# Altium footprint library BMS_Fuse_lib.PcbLib: 19 footprints (part 1 of 2)
Each footprint in its own frame and in the unit in brackets; x right, y up, seen from the top. Pads: shape width x height; smd on the part's side, far side on the other; paste and mask are expansions set on the pad; w line width, h text height; cw(c..) or ccw(c..) is an arc to the next point about the centre after c.
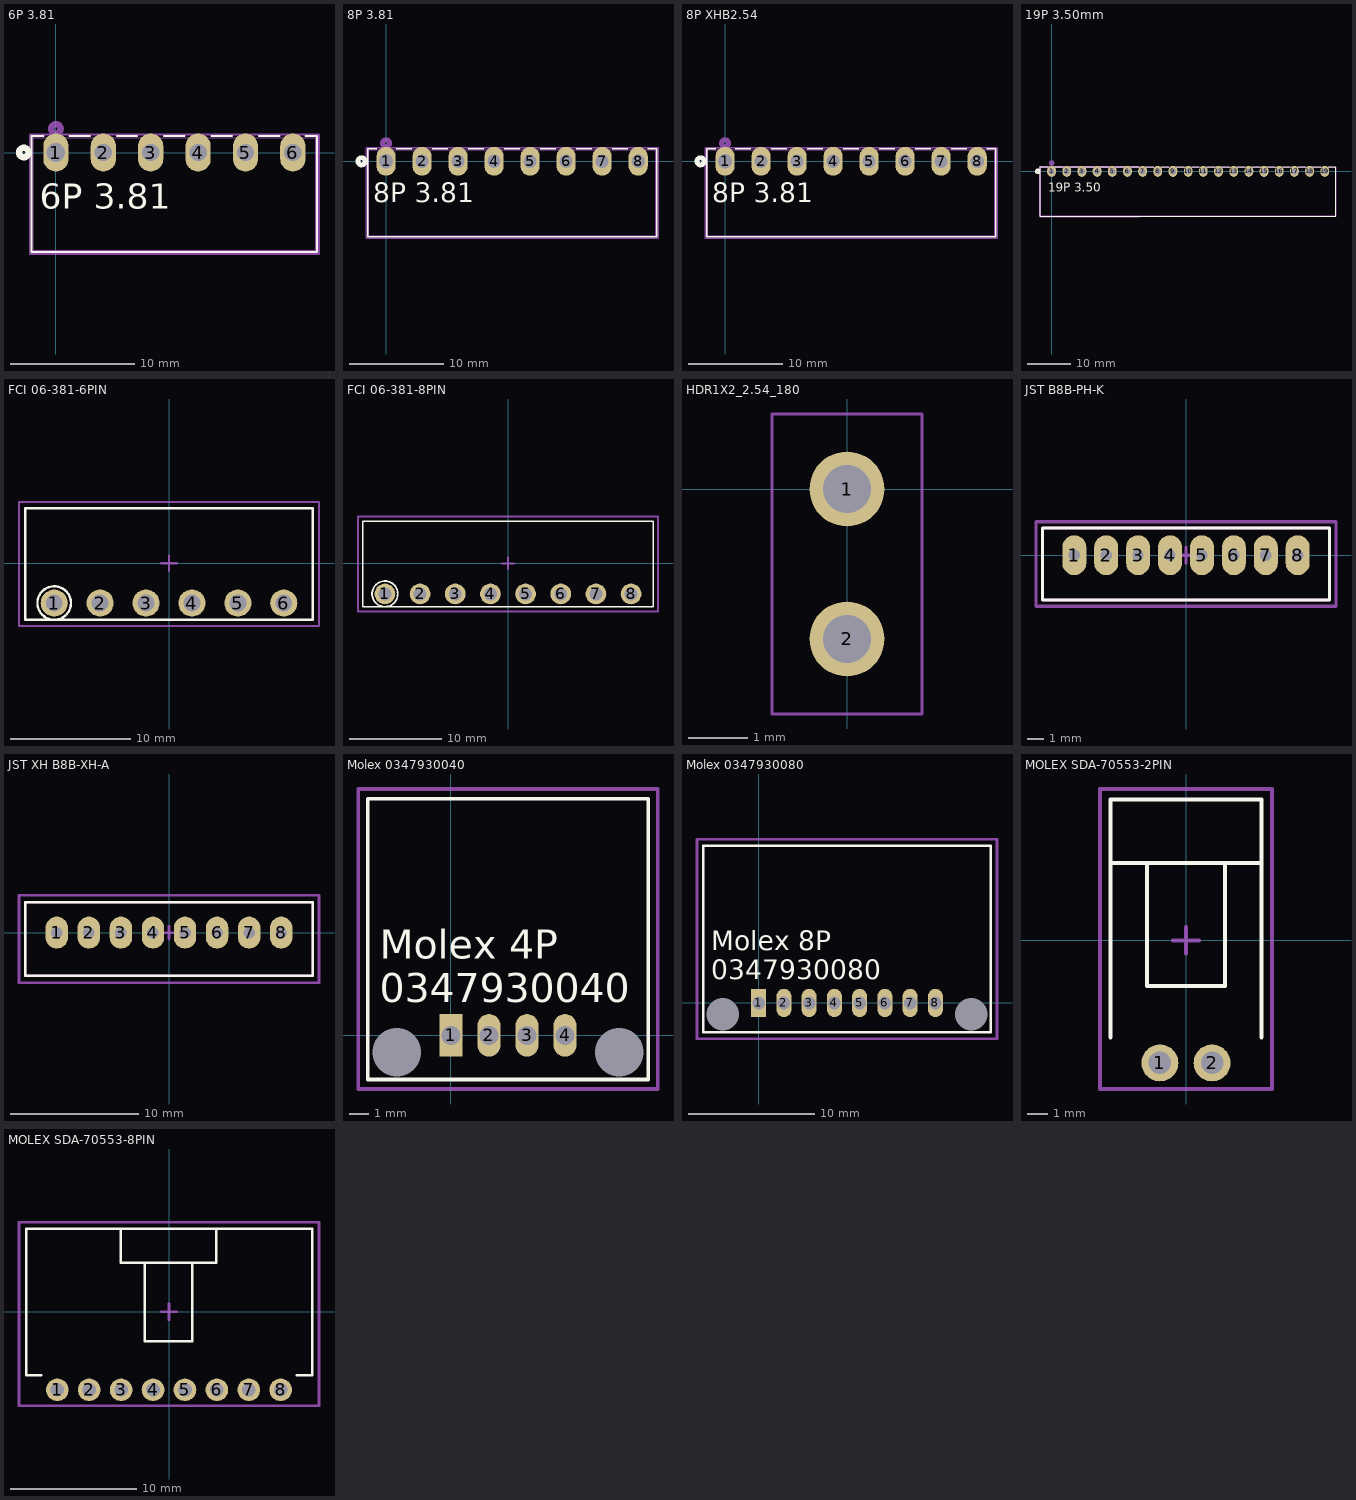
[diagram p0: the footprints below, top view; thin cyan lines are the x and y axes]

## 6P 3.81 [mil] "CONN., FEMALE, PCB-PLUG with Clamping yoke connection, 1X19, 3.50mm HORZ. R/A"
height 700
pads (6):
  oval 80x120 hole 59.06 mask+0: 1(0,0)
  oval 80x120 hole 55.12 mask+0: 2(150,0) 3(300,0) 4(450,0) 5(600,0) 6(750,0)
Top Overlay:
  circle w20: c-101.77,0 r15
  lines w6: -39.37,52 -76.77,52 -76.77,-314.96 698.88,-314.96 826.77,-314.96 826.77,52 789.37,52 ; 42.63,52.24 107.37,52.24 ; 192.63,52.24 257.37,52.24 ; 342.63,52.24 407.37,52.24 ; 492.63,52.24 557.37,52.24 ; 642.63,52.24 707.37,52.24
  text "6P 3.81" at -51.18,-177.17 h80
Mechanical 13:
  circle w20: c0,75 r15
  lines w1: -72.02,47.24 822.83,47.24 822.83,-310.04 -71.85,-310.04 -71.85,47.24
Mechanical 15:
  lines w6: -82.68,-320.87 -82.68,57.09 832.68,57.09 832.68,-320.87 -82.68,-320.87
3D body: height 10, standoff 0, extent 0,0 10,10
3D body "FCI 06-381 6Pos.STEP": height 299.21, standoff -138.78, extent -98.42,-307.21 848.42,55

## 8P 3.81 [mil] "CONN., FEMALE, PCB-PLUG with Clamping yoke connection, 1X19, 3.50mm HORZ. R/A"
height 700
pads (8):
  oval 80x120 hole 59.06 mask+0: 1(0,0)
  oval 80x120 hole 55.12 mask+0: 2(150,0) 3(300,0) 4(450,0) 5(600,0) 6(750,0) 7(900,0) 8(1050,0)
Top Overlay:
  circle w20: c-101.77,0 r15
  lines w6: -39.37,52 -76.77,52 -76.77,-314.96 698.88,-314.96 1126.77,-314.96 1126.77,52 1089.37,52 ; 42.63,52.24 107.37,52.24 ; 192.63,52.24 257.37,52.24 ; 342.63,52.24 407.37,52.24 ; 492.63,52.24 557.37,52.24 ; 642.63,52.24 707.37,52.24 ; 792.63,52.24 857.37,52.24 ; 942.63,52.24 1007.37,52.24
  text "8P 3.81" at -53.15,-170.28 h80
Mechanical 13:
  circle w20: c0,75 r15
  lines w1: -71.85,-310.04 -71.85,47.24 1122.83,47.24 1122.83,-310.04 -71.85,-310.04
Mechanical 15:
  lines w6: -82.68,-320.87 1132.68,-320.87 1132.68,57.09 -82.68,57.09 -82.68,-320.87
3D body: height 10, standoff 0, extent 0,0 10,10
3D body "FCI 06-381 8Pos.STEP": height 299.21, standoff -138.78, extent -98.42,-307.21 1148.42,55

## 8P XHB2.54 [mil] "CONN., FEMALE, PCB-PLUG with Clamping yoke connection, 1X19, 3.50mm HORZ. R/A"
height 700
pads (8):
  oval 80x120 hole 59.06 mask+0: 1(0,0)
  oval 80x120 hole 55.12 mask+0: 2(150,0) 3(300,0) 4(450,0) 5(600,0) 6(750,0) 7(900,0) 8(1050,0)
Top Overlay:
  circle w20: c-101.77,0 r15
  lines w6: -39.37,52 -76.77,52 -76.77,-314.96 698.88,-314.96 1126.77,-314.96 1126.77,52 1089.37,52 ; 42.63,52.24 107.37,52.24 ; 192.63,52.24 257.37,52.24 ; 342.63,52.24 407.37,52.24 ; 492.63,52.24 557.37,52.24 ; 642.63,52.24 707.37,52.24 ; 792.63,52.24 857.37,52.24 ; 942.63,52.24 1007.37,52.24
  text "8P 3.81" at -53.15,-170.28 h80
Mechanical 13:
  circle w20: c0,75 r15
  lines w1: -71.85,-310.04 1122.83,-310.04 1122.83,47.24 -71.85,47.24 -71.85,-310.04
Mechanical 15:
  lines w6: -82.68,-320.87 -82.68,57.09 1132.68,57.09 1132.68,-320.87 -82.68,-320.87
3D body: height 10, standoff 0, extent 0,0 10,10

## 19P 3.50mm [mil] "CONN., FEMALE, PCB-PLUG with Clamping yoke connection, 1X19, 3.50mm HORZ. R/A"
height 700
pads (19):
  oval 80x100 hole 55 mask+0: 1(0,0) 2(137.8,0) 3(275.59,0) 4(413.39,0) 5(551.18,0) 6(688.98,0) 7(826.77,0) 8(964.57,0) 9(1102.36,0) 10(1240.16,0) 11(1377.95,0) 12(1515.75,0) 13(1653.54,0) 14(1791.34,0) 15(1929.13,0) 16(2066.93,0) 17(2204.72,0) 18(2342.52,0) 19(2480.32,0)
Top Overlay:
  circle w20: c-126.51,0 r15
  lines w6: -30.42,40.43 -101.51,40.43 -101.51,-406.57 790.49,-406.57 2581.83,-406.57 2581.83,40.43 2510.74,40.43 ; 30.42,40.43 107.37,40.43 ; 168.22,40.43 245.17,40.43 ; 306.01,40.43 382.96,40.43 ; 443.81,40.43 520.76,40.43 ; 581.6,40.43 658.55,40.43 ; 719.4,40.43 790.49,40.43 ; 857.19,40.43 928.28,40.43 ; 994.99,40.43 1066.08,40.43 ; 1132.79,40.43 1203.87,40.43 ; 1270.58,40.43 1341.67,40.43 ; 1408.38,40.43 1479.46,40.43 ; 1546.17,40.43 1617.26,40.43 ; 1683.97,40.43 1755.06,40.43 ; 1821.76,40.43 1892.85,40.43 ; 1959.56,40.43 2030.65,40.43 ; 2097.35,40.43 2168.44,40.43 ; 2235.15,40.43 2306.24,40.43 ; 2372.94,40.43 2444.03,40.43
  text "19P 3.50" at -31.5,-184.06 h80
Bottom Overlay:
  circle w20: c-126.51,0 r15
Mechanical 13:
  circle w20: c0,75 r15
  lines w1: -96.51,-401.57 -96.51,35.43 2582.68,35.43 2582.68,-401.57 -96.51,-401.57
Mechanical 15:
  lines w6: 795.49,-411.57 -106.51,-411.57 -106.51,47.5 795.49,47.5
3D body "19P_v4.stp": height 218.34, standoff -434.59, extent -68.92,-444.52 2549.24,12.8
3D body: height 10, standoff 0, extent 0,0 10,10

## DHT11_v [mm]
3D body "DHT11_H.step": height 5.9, standoff -4.2, extent 6.05,-35.65 22.55,-22.95

## FCI 06-381-6PIN [mm] "FCI Pluggable Terminal Block"
height 7
pads (6):
  round 2.25 hole 1.4: 1(-9.525,-3.302) 2(-5.715,-3.302) 3(-1.905,-3.302) 4(1.905,-3.302) 5(5.715,-3.302) 6(9.525,-3.302)
Top Overlay:
  circle w0.2: c-9.525,-3.302 r1.393
  lines w0.2: -11.938,-4.699 11.938,-4.699 11.938,4.572 -11.938,4.572 -11.938,-4.699
Mechanical 15:
  lines w0.2: -0.635,0 0.635,0 ; 0,-0.635 0,0.635 ; -12.446,-5.207 12.446,-5.207 12.446,5.08 -12.446,5.08 -12.446,-5.207
3D body "FCI 06-381 6Pos.STEP": height 7.6, standoff -3.52, extent -12.025,-4.699 12.025,4.501

## FCI 06-381-8PIN [mm] "FCI Pluggable Terminal Block"
height 7
pads (8):
  round 2.25 hole 1.4: 1(-13.335,-3.302) 2(-9.525,-3.302) 3(-5.715,-3.302) 4(-1.905,-3.302) 5(1.905,-3.302) 6(5.715,-3.302) 7(9.525,-3.302) 8(13.335,-3.302)
Top Overlay:
  circle w0.2: c-13.335,-3.302 r1.393
  lines w0.2: -15.748,-4.699 15.748,-4.699 15.748,4.572 -15.748,4.572 -15.748,-4.699
Mechanical 15:
  lines w0.2: -0.635,0 0.635,0 ; 0,-0.635 0,0.635 ; -16.256,-5.207 16.256,-5.207 16.256,5.08 -16.256,5.08 -16.256,-5.207
3D body "FCI 06-381 8Pos.STEP": height 7.6, standoff -3.52, extent -15.835,-4.699 15.835,4.501

## HDR1X2_2.54_180 [mil]
height 169.29
pads (2):
  round 50 hole 32: 1(0,0) 2(0,-100)
Mechanical 13:
  lines w2: -50,-150 50,-150 50,50 -50,50 -50,-150
Mechanical 14:
  lines w2: -50,-150 50,-150 50,50 -50,50 -50,-150
  text ".Designator" at -31,-70 h80
3D body "pin_header_aw140-eg-g02d.stp": height 322.83, standoff -118.11, extent -49.18,-150 49.18,50

## JST B8B-PH-K [mm]
height 6
pads (8):
  oval 1.5x2.5 hole 0.7: 1(-7,0) 2(-5,0) 3(-3,0) 4(-1,0) 5(1,0) 6(3,0) 7(5,0) 8(7,0)
Top Overlay:
  lines w0.2: -9,-2.8 -9,1.7 9,1.7 9,-2.8 -9,-2.8
Bottom Overlay:
  circle w0.254: c-8.1,1.1 r0.141
Mechanical 13:
  lines w0.2: 8.95,1.7 -9,1.7 -9,-2.8 9,-2.8 9,1.7
Mechanical 15:
  lines w0.2: -0.5,0 0.5,0 ; 0,-0.5 0,0.5 ; -9.4,-3.2 9.4,-3.2 9.4,2.1 -9.4,2.1 -9.4,-3.2
3D body "JST B8B-PH-K-S.STEP": height 6, standoff -3.4, extent -8.95,-2.8 8.95,1.7

## JST XH B8B-XH-A [mm]
height 7
pads (8):
  oval 1.75x2.5 hole 0.9: 1(-8.75,0) 2(-6.25,0) 3(-3.75,0) 4(-1.25,0) 5(1.25,0) 6(3.75,0) 7(6.25,0) 8(8.75,0)
Top Overlay:
  lines w0.2: -11.2,-3.375 -11.2,2.375 11.2,2.375 11.2,-3.375 -11.2,-3.375
Mechanical 1:
  lines w0.2: -11.2,-3.375 11.2,-3.375 11.2,2.375 -11.2,2.375 -11.2,-3.375
Mechanical 15:
  lines w0.2: -0.5,0 0.5,0 ; 0,-0.5 0,0.5 ; -11.7,-3.9 -11.7,2.9 11.7,2.9 11.7,-3.9 -11.7,-3.9
3D body "JST B8B-XH-A.STEP": height 7, standoff -3.4, extent -11.2,-3.375 11.2,2.375

## Molex 0347930040 [mm] "FCI Pluggable Terminal Block"
height 7
pads (6):
  round 0 hole 2.55 unplated: 0(-2.85,-0.9) 0(8.85,-0.9)
  rect 1.2x2.25 hole 1: 1(0,0)
  oval 1.2x2.25 hole 1: 2(2,0) 3(4,0) 4(6,0)
Top Overlay:
  lines w0.2: -4.375,-2.325 -4.375,12.45 10.375,12.45 10.375,-2.325 -4.375,-2.325
  text "Molex 4P / 0347930040" at -3.75,1.75 h1.52
Mechanical 15:
  lines w0.2: -4.883,-2.825 -4.883,12.958 10.883,12.958 10.883,-2.808 ; -4.875,-2.825 10.883,-2.825
3D body "Molex 4P 0347930040.stp": height 9.89, standoff -3.75, extent -4.286,-2.3 10.336,15.5

## Molex 0347930080 [mm] "FCI Pluggable Terminal Block"
height 7
pads (10):
  round 0 hole 2.55 unplated: 0(-2.85,-0.9) 0(16.85,-0.9)
  rect 1.2x2.25 hole 1: 1(0,0)
  oval 1.2x2.25 hole 1: 2(2,0) 3(4,0) 4(6,0) 5(8,0) 6(10,0) 7(12,0) 8(14,0)
Top Overlay:
  lines w0.2: -4.375,-2.325 -4.375,12.45 18.375,12.45 18.375,-2.325 -4.375,-2.325
  text "Molex 8P / 0347930080" at -3.75,1.875 h1.52
Mechanical 15:
  lines w0.2: -4.883,-2.825 -4.883,12.958 18.883,12.958 18.883,-2.825 -4.875,-2.825
3D body "Molex 8P 0347930080.stp": height 10.5, standoff -3.65, extent -4.336,-2.375 18.286,15.425

## MOLEX SDA-70553-2PIN [mm] "SL Right angle header with latch, 0.100 centres, SDA-70553"
height 6.99
pads (2):
  round 1.8 hole 1.09: 1(-1.27,-5.969) 2(1.27,-5.969)
Top Overlay:
  lines w0.2: -3.683,-4.719 -3.683,6.858 3.683,6.858 3.683,-4.719 ; -3.627,3.765 3.683,3.765 ; -1.905,3.765 -1.905,-2.219 1.905,-2.219 1.905,3.765
Mechanical 15:
  lines w0.2: -0.635,0 0.635,0 ; 0,-0.635 0,0.635 ; -4.191,-7.239 4.191,-7.239 4.191,7.366 -4.191,7.366 -4.191,-7.239
3D body "705530001.STEP": height 6.96, standoff -3.32, extent -3.683,-6.719 3.683,6.87

## MOLEX SDA-70553-8PIN [mm] "SL Right angle header with latch, 0.100 centres, SDA-70553"
height 6.99
pads (8):
  round 1.8 hole 1.09: 1(-8.89,-6.223) 2(-6.35,-6.223) 3(-3.81,-6.223) 4(-1.27,-6.223) 5(1.27,-6.223) 6(3.81,-6.223) 7(6.35,-6.223) 8(8.89,-6.223)
Top Overlay:
  lines w0.2: -10.16,-5.08 -11.343,-5.08 -11.343,-4.973 -11.343,6.604 11.39,6.604 11.39,-4.973 11.39,-5.08 10.16,-5.08 ; -3.85,6.55 -3.85,3.892 3.77,3.892 3.77,6.55 ; -1.945,3.892 -1.945,-2.346 1.865,-2.346 1.865,3.892
Mechanical 15:
  lines w0.2: -0.635,0 0.635,0 ; 0,-0.635 0,0.635 ; -11.938,-7.493 11.938,-7.493 11.938,7.112 -11.938,7.112 -11.938,-7.493
3D body "705530007.STEP": height 6.96, standoff -3.32, extent -11.39,-6.973 11.47,6.616

## PCBComponent_1 [mm]

## PCBComponent_1 - duplicate [mm]